# Altium footprint library standard-graphic-logo.PcbLib: 61 footprints (part 2 of 4)
Each footprint in its own frame and in the unit in brackets; x right, y up, seen from the top. Pads: shape width x height; smd on the part's side, far side on the other; paste and mask are expansions set on the pad; w line width, h text height; cw(c..) or ccw(c..) is an arc to the next point about the centre after c.
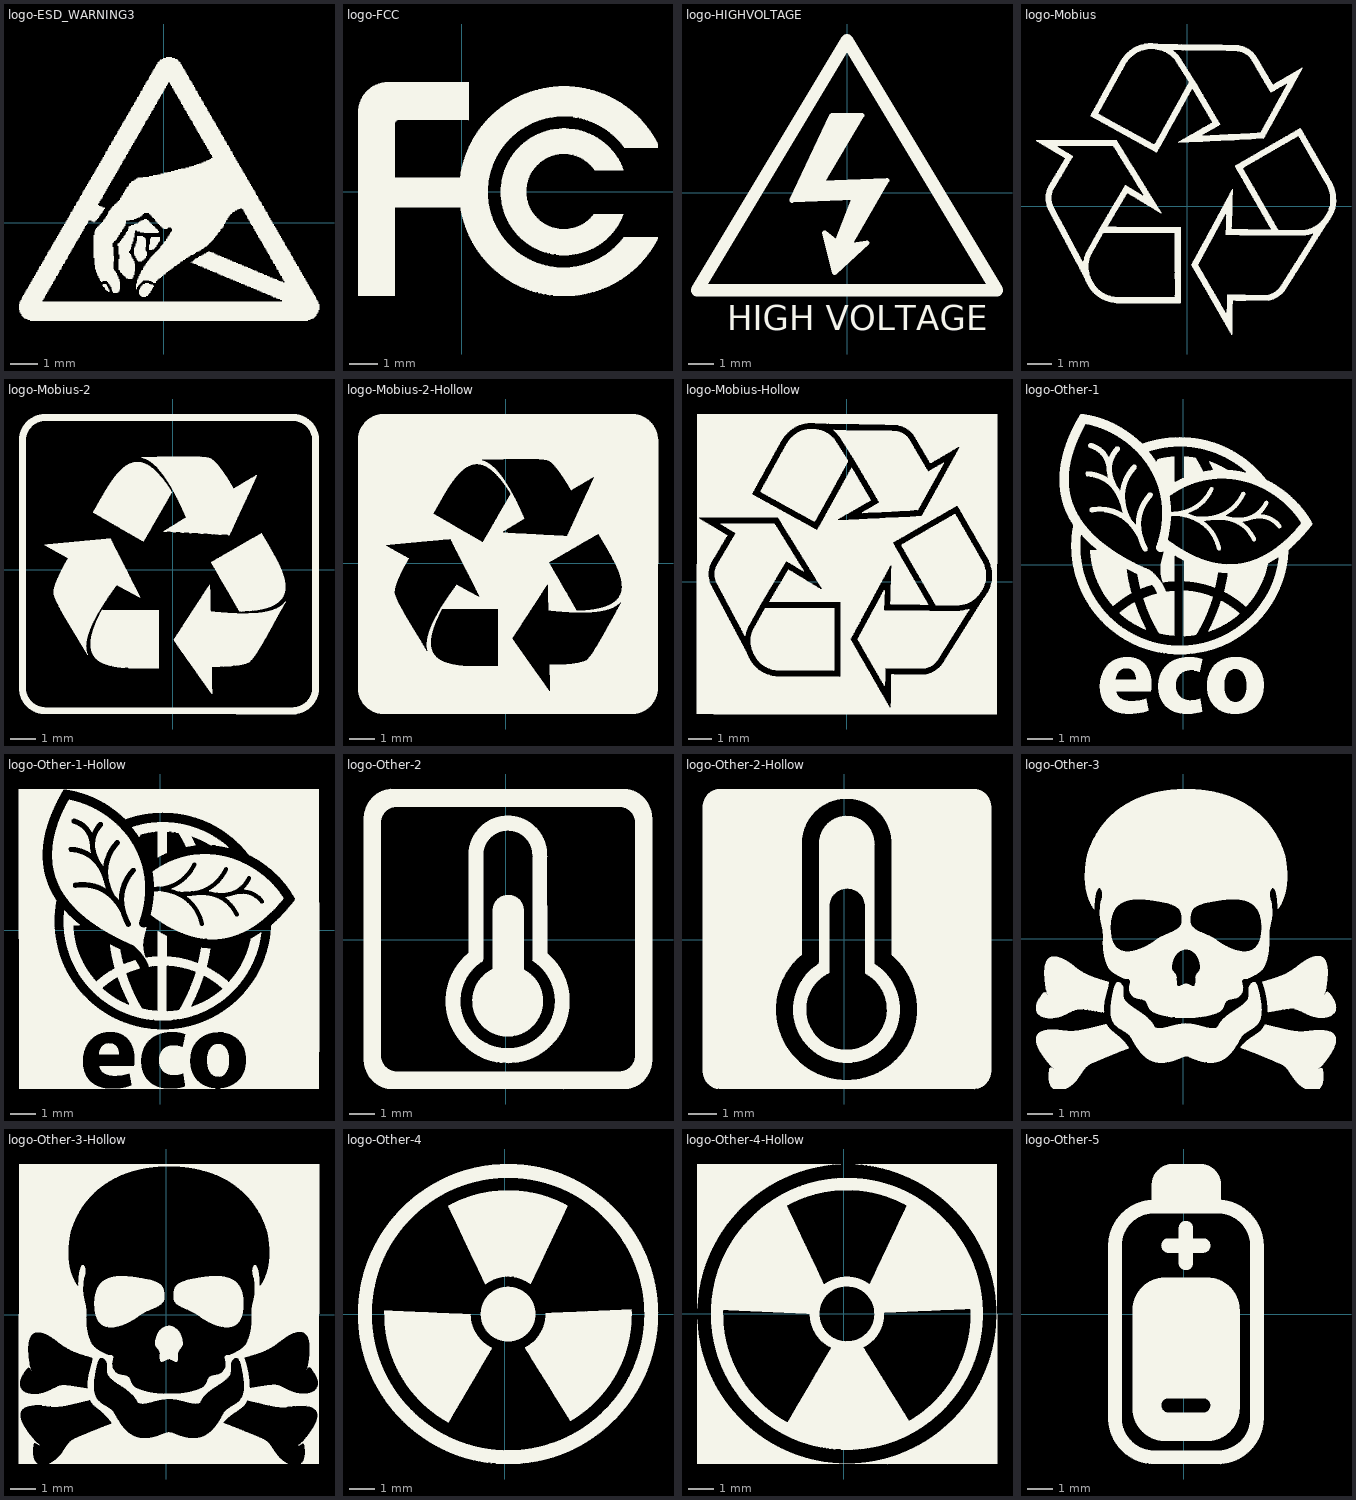
[diagram p1: the footprints below, top view; thin cyan lines are the x and y axes]

## logo-ESD_WARNING3 [mm]
Top Overlay:
  drawing of 6 lines, arcs and shapes, not listed
  text "TarahiBoard.com" at 0.147,-3.409 h0.1

## logo-FCC [mm]
Top Overlay:
  drawing of 2 lines, arcs and shapes, not listed
  text "TarahiBoard.com" at -2.012,-0.234 h0.1

## logo-HIGHVOLTAGE [mm]
Top Overlay:
  region: 0.6,3.1 -0.6,3.1 -2.2,-0.3 0.3,-0.2 -0.4,-2 -0.9,-1.6 -0.5,-3.2 0.8,-2 0.1,-2.1 1.6,0.5 -1,0.4
  lines w0.2: -2.2,-0.3 -0.6,3.1 0.6,3.1 -1,0.4 1.6,0.5 0.1,-2.1 0.8,-2 -0.5,-3.2 -0.9,-1.6 -0.4,-2 0.3,-0.2 -2.2,-0.3
  lines w0.5: -6,-3.9 6,-3.9 0,6.1 -6,-3.9
  text "HIGH VOLTAGE" at -4.8,-5.5 h1
  text "TarahiBoard.com" at -0.742,0.02 h0.1

## logo-Mobius [mm]
Top Overlay:
  drawing of 3 lines, arcs and shapes, not listed

## logo-Mobius-2 [mm]
Top Overlay:
  drawing of 9 lines, arcs and shapes, not listed

## logo-Mobius-2-Hollow [mm]
Top Overlay:
  drawing of 1 lines, arcs and shapes, not listed

## logo-Mobius-Hollow [mm]
Top Overlay:
  drawing of 7 lines, arcs and shapes, not listed

## logo-Other-1 [mm]
Top Overlay:
  drawing of 8 lines, arcs and shapes, not listed
  text "TarahiBoard.com" at 1.417,-0.107 h0.1

## logo-Other-1-Hollow [mm]
Top Overlay:
  drawing of 6 lines, arcs and shapes, not listed
  text "TarahiBoard.com" at 4.084,-3.409 h0.1

## logo-Other-2 [mm]
Top Overlay:
  drawing of 3 lines, arcs and shapes, not listed
  text "TarahiBoard.com" at -0.361,-5.695 h0.1

## logo-Other-2-Hollow [mm]
Top Overlay:
  drawing of 2 lines, arcs and shapes, not listed
  text "TarahiBoard.com" at 2.687,-1.377 h0.1

## logo-Other-3 [mm]
Top Overlay:
  drawing of 6 lines, arcs and shapes, not listed
  text "TarahiBoard.com" at -0.361,3.703 h0.1

## logo-Other-3-Hollow [mm]
Top Overlay:
  drawing of 5 lines, arcs and shapes, not listed
  text "TarahiBoard.com" at 4.084,5.481 h0.1

## logo-Other-4 [mm]
Top Overlay:
  drawing of 5 lines, arcs and shapes, not listed
  text "TarahiBoard.com" at -0.615,3.576 h0.1

## logo-Other-4-Hollow [mm]
Top Overlay:
  drawing of 3 lines, arcs and shapes, not listed
  text "TarahiBoard.com" at -0.615,-4.044 h0.1

## logo-Other-5 [mm]
Top Overlay:
  drawing of 3 lines, arcs and shapes, not listed
  text "TarahiBoard.com" at -0.742,-1.885 h0.1